# Altium footprint library 贴片电感.PcbLib: 92 footprints (part 2 of 6)
Each footprint in its own frame and in the unit in brackets; x right, y up, seen from the top. Pads: shape width x height; smd on the part's side, far side on the other; paste and mask are expansions set on the pad; w line width, h text height; cw(c..) or ccw(c..) is an arc to the next point about the centre after c.
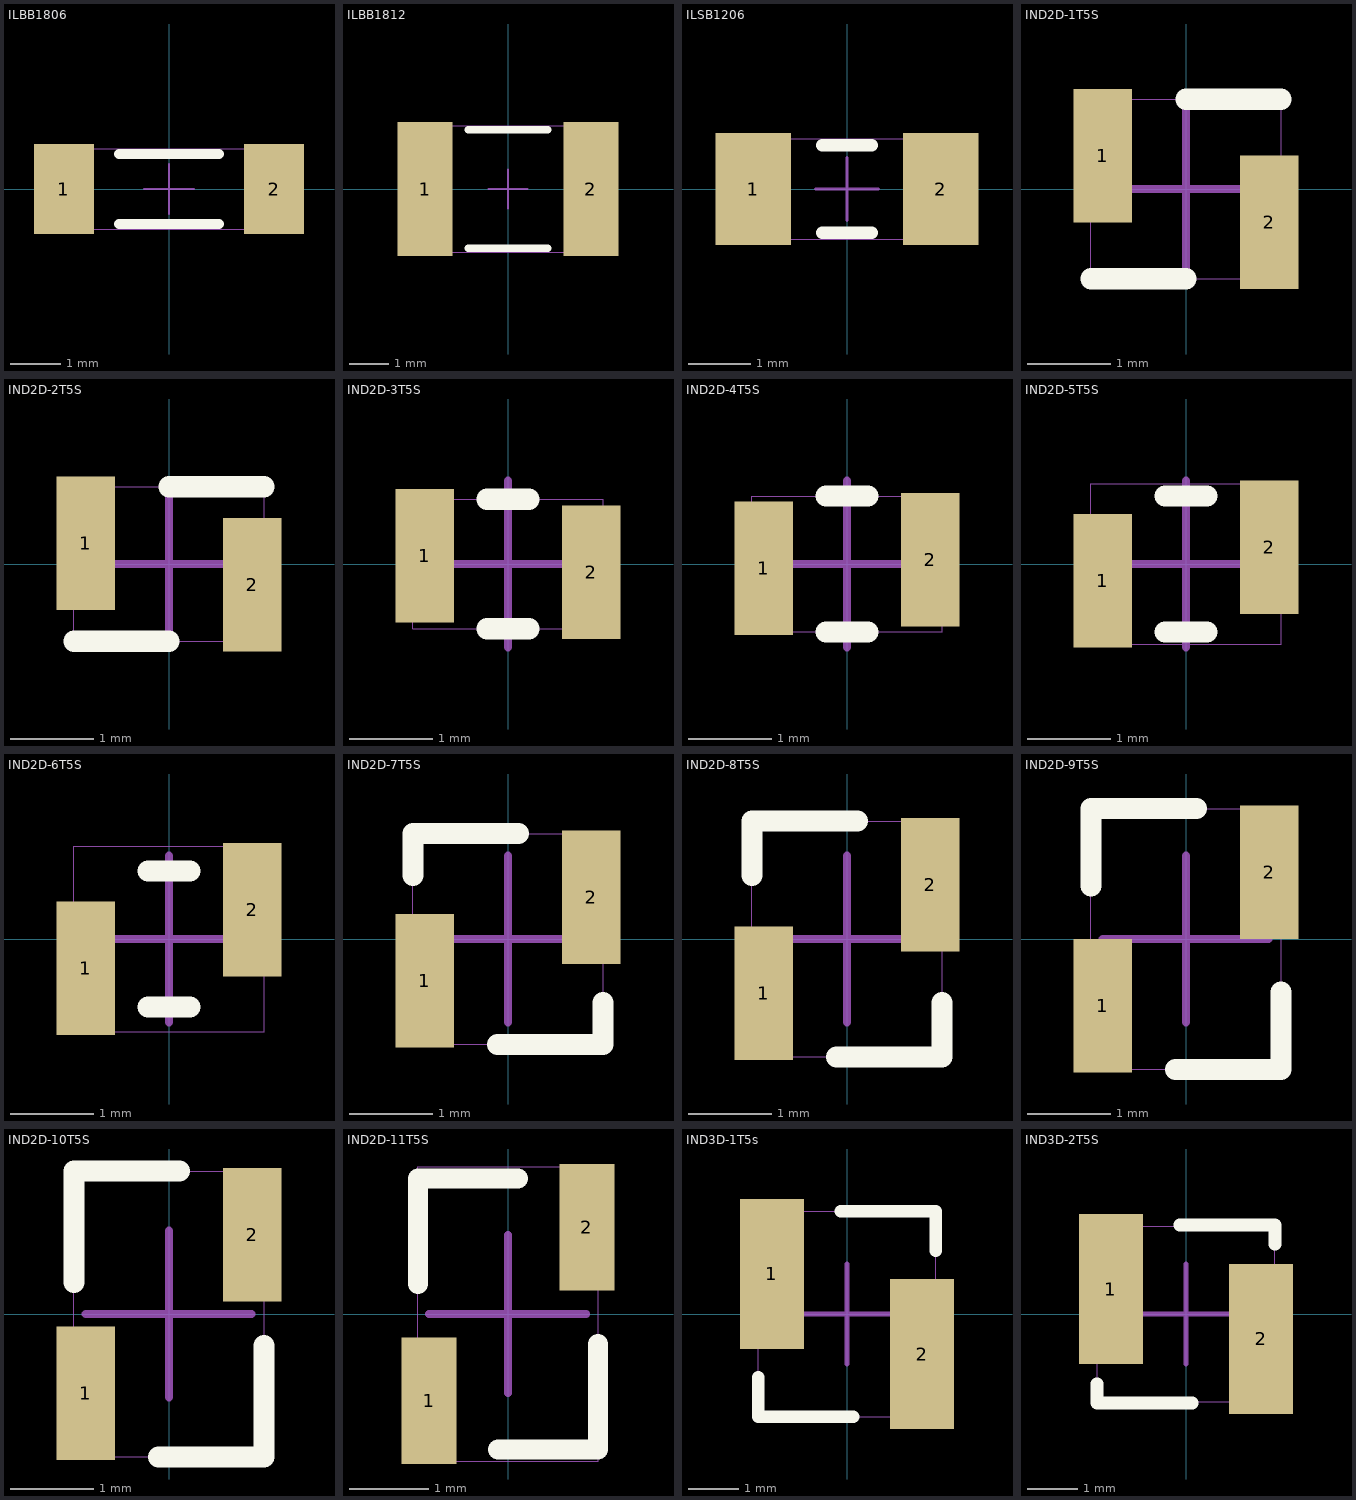
[diagram p1: the footprints below, top view; thin cyan lines are the x and y axes]

## ILBB1806 [mm] "贴片磁珠"
height 1.6
pads (2):
  rect 1.2x1.8 smd: 1(-2.1,0) 2(2.1,0)
Top Overlay:
  lines w0.2: -1,-0.7 1,-0.7 ; -1,0.7 1,0.7
Mechanical 13:
  lines w0.01: -2.25,-0.8 -2.25,0.8 2.25,0.8 2.25,-0.8 -2.25,-0.8
Mechanical 15:
  lines w0.05: -0.5,0 0.5,0 ; 0,-0.5 0,0.5
3D body: height 1.65, standoff 0.05, extent -2.25,-0.8 2.25,0.8

## ILBB1812 [mm] "贴片磁珠"
height 1.5
pads (2):
  rect 1.4x3.4 smd: 1(-2.1,0) 2(2.1,0)
Top Overlay:
  lines w0.2: -1,-1.5 1,-1.5 ; -1,1.5 1,1.5
Mechanical 13:
  lines w0.01: -2.25,-1.6 -2.25,1.6 2.25,1.6 2.25,-1.6 -2.25,-1.6
Mechanical 15:
  lines w0.05: -0.5,0 0.5,0 ; 0,-0.5 0,0.5
3D body: height 1.6, standoff 0.1, extent -2.25,-1.6 2.25,1.6

## ILSB1206 [mm] "贴片磁珠"
height 0.8
pads (2):
  rect 1.2x1.8 smd: 1(-1.5,0) 2(1.5,0)
Top Overlay:
  lines w0.2: -0.4,-0.7 0.4,-0.7 ; -0.4,0.7 0.4,0.7
Mechanical 13:
  lines w0.01: -1.6,-0.8 -1.6,0.8 1.6,0.8 1.6,-0.8 -1.6,-0.8
Mechanical 15:
  lines w0.05: -0.5,0 0.5,0 ; 0,-0.5 0,0.5
3D body: height 1.1, standoff 0, extent -1.6,-0.8 1.6,0.8

## IND2D-1T5S [mm] "贴片空芯线圈"
height 2.8
pads (2):
  rect 0.7x1.6 smd: 1(-1,0.4) 2(1,-0.4)
Top Overlay:
  lines w0.254: -1.14,-1.077 0,-1.077 ; 0,1.078 1.14,1.078
Mechanical 13:
  lines w0.01: -1.14,-1.078 -1.14,1.078 1.14,1.078 1.14,-1.078 -1.14,-1.078
Mechanical 15:
  lines w0.1: -1,0 0.991,0 ; 0,-1 0,1
3D body: height 2.78, standoff 0, extent -1.14,-1.077 1.14,1.078

## IND2D-2T5S [mm] "贴片空芯线圈"
height 2.8
pads (2):
  rect 0.7x1.6 smd: 1(-1,0.25) 2(1,-0.25)
Top Overlay:
  lines w0.254: -1.14,-0.927 0,-0.927 ; 0,0.928 1.14,0.928
Mechanical 13:
  lines w0.01: -1.14,-0.927 1.14,-0.927 1.14,0.928 -1.14,0.928 -1.14,-0.927
Mechanical 15:
  lines w0.1: -1,0 0.991,0 ; 0,-1 0,1
3D body: height 2.78, standoff 0, extent -1.14,-0.927 1.14,0.928

## IND2D-3T5S [mm] "贴片空芯线圈"
height 2.8
pads (2):
  rect 0.7x1.6 smd: 1(-1,0.1) 2(1,-0.1)
Top Overlay:
  lines w0.254: -0.254,-0.778 0.254,-0.778 ; -0.254,0.777 0.254,0.777
Mechanical 13:
  lines w0.01: -1.14,-0.778 1.14,-0.778 1.14,0.777 -1.14,0.777 -1.14,-0.778
Mechanical 15:
  lines w0.1: -1,0 0.991,0 ; 0,-1 0,1
3D body: height 2.78, standoff 0, extent -1.14,-0.778 1.14,0.777

## IND2D-4T5S [mm] "贴片空芯线圈"
height 2.8
pads (2):
  rect 0.7x1.6 smd: 1(-1,-0.05) 2(1,0.05)
Top Overlay:
  lines w0.254: -0.254,-0.815 0.254,-0.815 ; -0.254,0.815 0.254,0.815
Mechanical 13:
  lines w0.01: -1.14,-0.815 -1.14,0.815 1.14,0.815 1.14,-0.815 -1.14,-0.815
Mechanical 15:
  lines w0.1: -1,0 0.991,0 ; 0,-1 0,1
3D body: height 2.78, standoff 0, extent -1.14,-0.815 1.14,0.815

## IND2D-5T5S [mm] "贴片空芯线圈"
height 2.8
pads (2):
  rect 0.7x1.6 smd: 1(-1,-0.2) 2(1,0.2)
Top Overlay:
  lines w0.254: -0.254,-0.815 0.254,-0.815 ; -0.254,0.815 0.254,0.815
Mechanical 13:
  lines w0.01: -1.14,-0.965 -1.14,0.965 1.14,0.965 1.14,-0.965 -1.14,-0.965
Mechanical 15:
  lines w0.1: -1,0 0.991,0 ; 0,-1 0,1
3D body: height 2.78, standoff 0, extent -1.14,-0.965 1.14,0.965

## IND2D-6T5S [mm] "贴片空芯线圈"
height 2.8
pads (2):
  rect 0.7x1.6 smd: 1(-1,-0.35) 2(1,0.35)
Top Overlay:
  lines w0.254: -0.254,-0.815 0.254,-0.815 ; -0.254,0.815 0.254,0.815
Mechanical 13:
  lines w0.01: -1.14,-1.115 1.14,-1.115 1.14,1.115 -1.14,1.115 -1.14,-1.115
Mechanical 15:
  lines w0.1: -1,0 0.991,0 ; 0,-1 0,1
3D body: height 2.78, standoff 0, extent -1.14,-1.115 1.14,1.115

## IND2D-7T5S [mm] "贴片空芯线圈"
height 2.8
pads (2):
  rect 0.7x1.6 smd: 1(-1,-0.5) 2(1,0.5)
Top Overlay:
  lines w0.254: -1.14,0.765 -1.14,1.265 0.127,1.265 ; -0.127,-1.265 1.14,-1.265 1.14,-0.765
Mechanical 13:
  lines w0.01: -1.14,-1.265 1.14,-1.265 1.14,1.265 -1.14,1.265 -1.14,-1.265
Mechanical 15:
  lines w0.1: -1,0 0.991,0 ; 0,-1 0,1
3D body: height 2.78, standoff 0, extent -1.14,-1.265 1.14,1.265

## IND2D-8T5S [mm] "贴片空芯线圈"
height 2.8
pads (2):
  rect 0.7x1.6 smd: 1(-1,-0.65) 2(1,0.65)
Top Overlay:
  lines w0.254: -1.14,0.765 -1.14,1.415 0.127,1.415 ; -0.127,-1.415 1.14,-1.415 1.14,-0.765
Mechanical 13:
  lines w0.01: -1.14,-1.415 1.14,-1.415 1.14,1.415 -1.14,1.415 -1.14,-1.415
Mechanical 15:
  lines w0.1: -1,0 0.991,0 ; 0,-1 0,1
3D body: height 2.78, standoff 0, extent -1.14,-1.415 1.14,1.415

## IND2D-9T5S [mm] "贴片空芯线圈"
height 2.8
pads (2):
  rect 0.7x1.6 smd: 1(-1,-0.8) 2(1,0.8)
Top Overlay:
  lines w0.254: -1.14,0.635 -1.14,1.565 0.127,1.565 ; -0.127,-1.565 1.14,-1.565 1.14,-0.635
Mechanical 13:
  lines w0.01: -1.14,-1.565 1.14,-1.565 1.14,1.565 -1.14,1.565 -1.14,-1.565
Mechanical 15:
  lines w0.1: -1,0 0.991,0 ; 0,-1 0,1
3D body: height 2.78, standoff 0, extent -1.14,-1.565 1.14,1.565

## IND2D-10T5S [mm] "贴片空芯线圈"
height 2.8
pads (2):
  rect 0.7x1.6 smd: 1(-1,-0.95) 2(1,0.95)
Top Overlay:
  lines w0.254: -1.14,0.381 -1.14,1.715 0.127,1.715 ; -0.127,-1.715 1.14,-1.715 1.14,-0.381
Mechanical 13:
  lines w0.01: -1.14,-1.715 1.14,-1.715 1.14,1.715 -1.14,1.715 -1.14,-1.715
Mechanical 15:
  lines w0.1: -1,0 0.991,0 ; 0,-1 0,1
3D body: height 2.78, standoff 0, extent -1.14,-1.715 1.14,1.715

## IND2D-11T5S [mm] "贴片空芯线圈"
height 2.8
pads (2):
  rect 0.7x1.6 smd: 1(-1,-1.1) 2(1,1.1)
Top Overlay:
  lines w0.254: -1.14,0.381 -1.14,1.715 0.127,1.715 ; -0.127,-1.715 1.14,-1.715 1.14,-0.381
Mechanical 13:
  lines w0.01: -1.14,-1.865 -1.14,1.865 1.14,1.865 1.14,-1.865 -1.14,-1.865
Mechanical 15:
  lines w0.1: -1,0 0.991,0 ; 0,-1 0,1
3D body: height 2.78, standoff 0, extent -1.14,-1.865 1.14,1.865

## IND3D-1T5s [mm] "贴片空芯线圈"
height 5.2
pads (2):
  rect 1.27x3 smd: 1(-1.5,0.8) 2(1.5,-0.8)
Top Overlay:
  lines w0.254: -1.775,-1.27 -1.775,-2.053 0.127,-2.053 ; -0.127,2.053 1.775,2.053 1.775,1.27
Mechanical 13:
  lines w0.01: -1.775,-2.053 1.775,-2.053 1.775,2.053 -1.775,2.053 -1.775,-2.053
Mechanical 15:
  lines w0.1: -1,0 0.991,0 ; 0,-1 0,1
3D body: height 4.93, standoff 0, extent -1.775,-2.053 1.775,2.053

## IND3D-2T5S [mm] "贴片空芯线圈"
height 5.2
pads (2):
  rect 1.27x3 smd: 1(-1.5,0.5) 2(1.5,-0.5)
Top Overlay:
  lines w0.254: -1.778,-1.397 -1.778,-1.778 0.124,-1.778 ; -0.124,1.778 1.778,1.778 1.778,1.397
Mechanical 13:
  lines w0.01: -1.775,-1.753 -1.775,1.752 1.775,1.752 1.775,-1.753 -1.775,-1.753
Mechanical 15:
  lines w0.1: -1,0 0.991,0 ; 0,-1 0,1
3D body: height 4.93, standoff 0, extent -1.775,-1.753 1.775,1.752